# Altium footprint library USB-Mini_USB-Micro_USB.PcbLib: 33 footprints (part 3 of 3)
Each footprint in its own frame and in the unit in brackets; x right, y up, seen from the top. Pads: shape width x height; smd on the part's side, far side on the other; paste and mask are expansions set on the pad; w line width, h text height; cw(c..) or ccw(c..) is an arc to the next point about the centre after c.
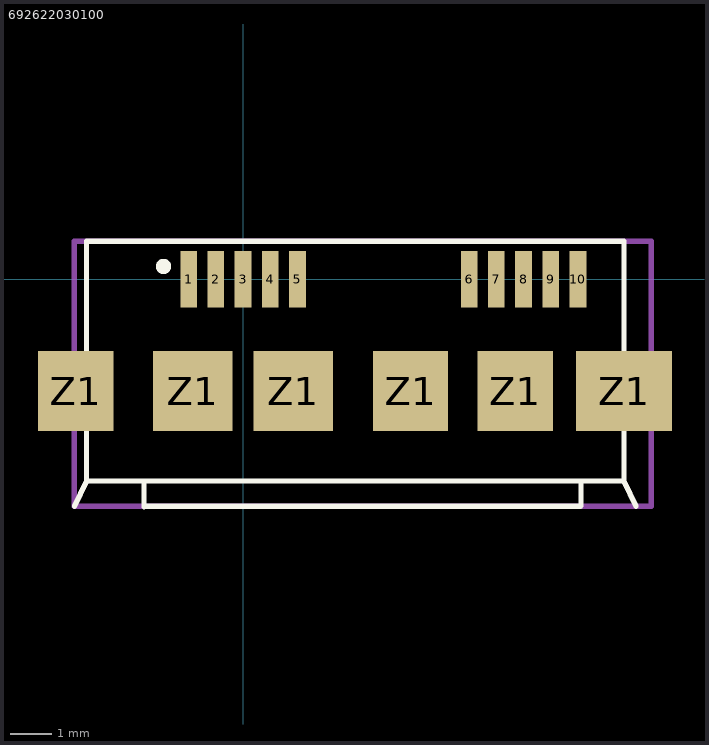
[diagram p2: the footprint, top view; thin cyan lines are the x and y axes]

## 692622030100 [mm] "Receptacle SMT"
height 2.58
pads (16):
  rect 0.4x1.35 smd: 1(-1.3,0) 2(-0.65,0) 3(0,0) 4(0.65,0) 5(1.3,0) 6(5.4,0) 7(6.05,0) 8(6.7,0) 9(7.35,0) 10(8,0)
  rect 1.8x1.9 smd: Z1(-4,-2.675) Z1(4,-2.675) Z1(6.5,-2.675)
  rect 1.9x1.9 smd: Z1(-1.2,-2.675) Z1(1.2,-2.675)
  rect 2.3x1.9 smd: Z1(9.1,-2.675)
Top Overlay:
  circle w0.254: c-1.901,0.302 r0.054
  lines w0.127: -4.025,-5.43 -3.74,-4.825 ; -2.364,-4.829 -2.364,-5.437 -2.357,-5.43 8.06,-5.43 8.074,-5.416 8.074,-4.824 ; 9.385,-5.43 9.1,-4.825 ; -3.74,-4.825 9.1,-4.825 ; -3.74,-4.825 -3.74,0.9 9.1,0.9 9.1,-4.825
Mechanical 15:
  lines w0.127: -4.031,-5.43 9.75,-5.43 9.75,0.9 -4.031,0.9 -4.031,-5.43
3D body: height 2.76, standoff -0.19, extent -3.995,-5.384 9.747,0.218